# Altium footprint library Molex FFC - FPC Connectors (Through-Hole).PcbLib: 219 footprints (part 5 of 14)
Each footprint in its own frame and in the unit in brackets; x right, y up, seen from the top. Pads: shape width x height; smd on the part's side, far side on the other; paste and mask are expansions set on the pad; w line width, h text height; cw(c..) or ccw(c..) is an arc to the next point about the centre after c.
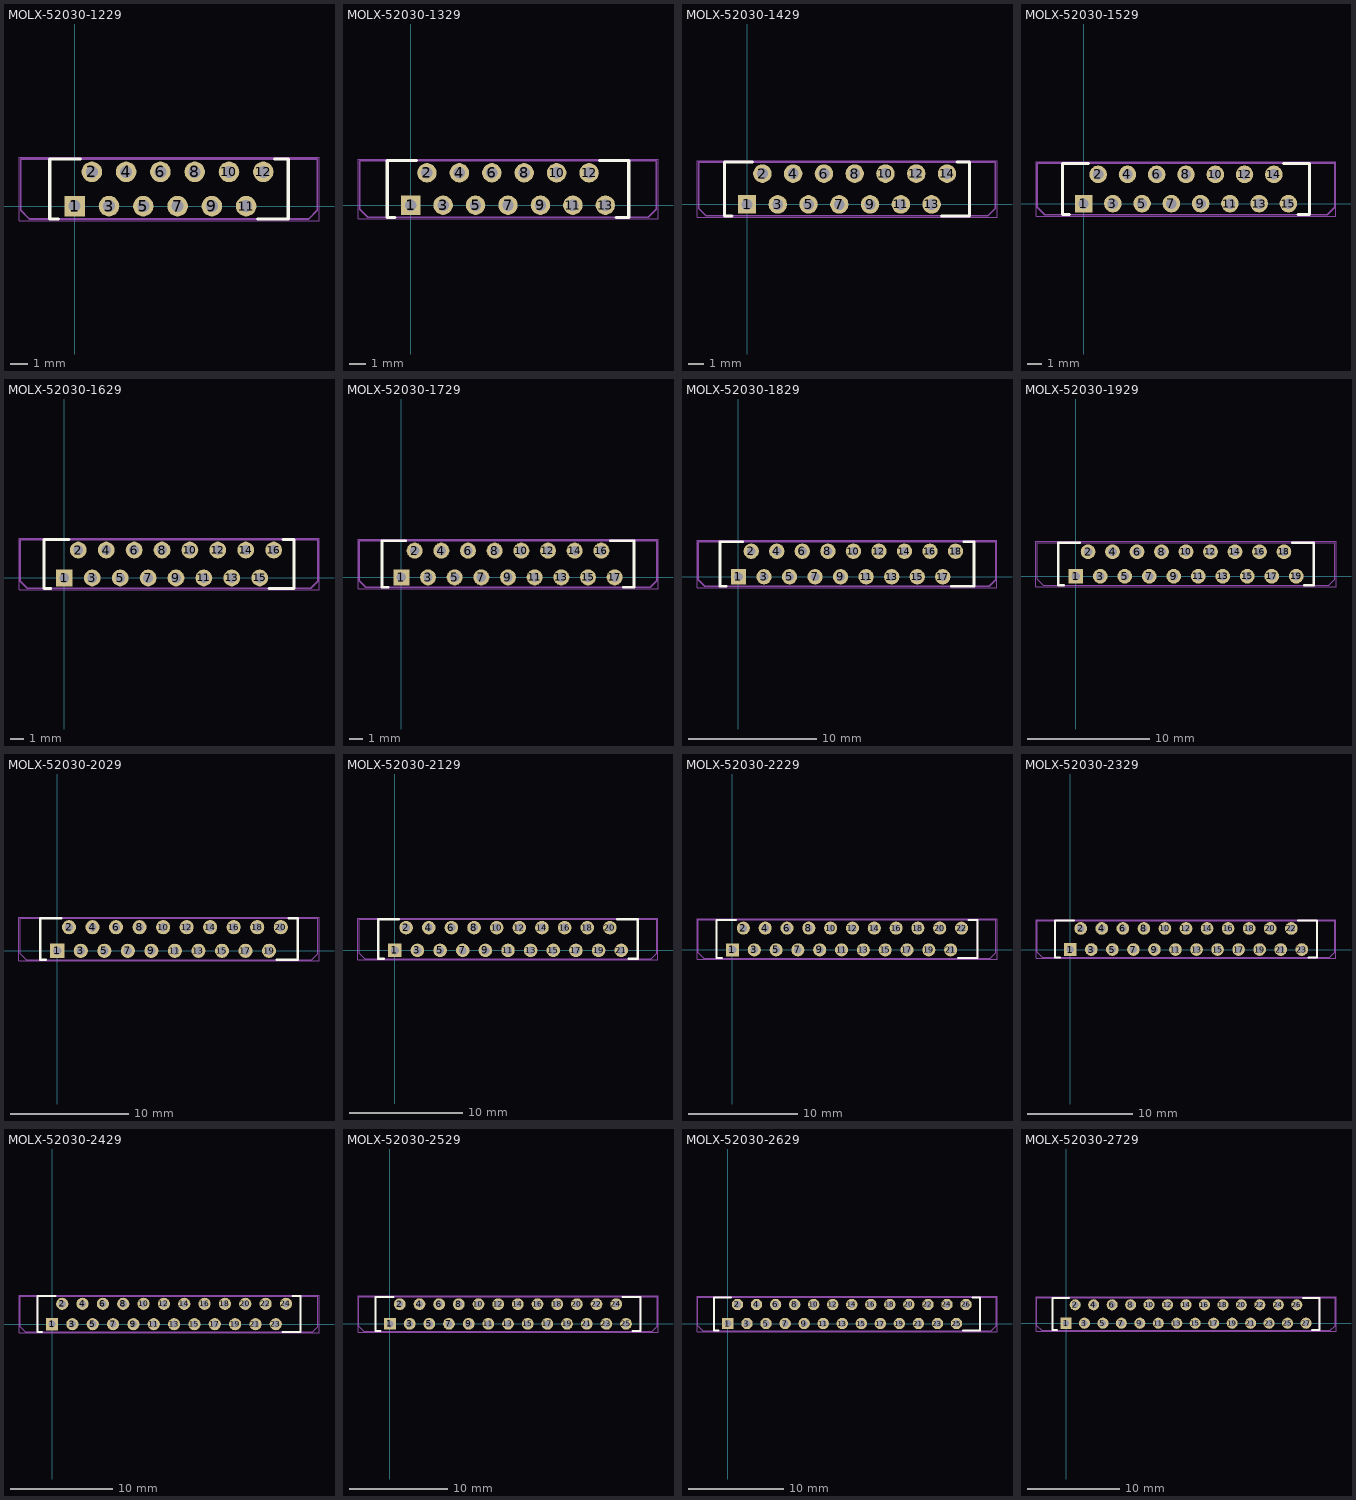
[diagram p4: the footprints below, top view; thin cyan lines are the x and y axes]

## MOLX-52030-1229 [mm] "FPC Connector, 12-Leads, Vertical, Pitch 1.0 mm, Mated Height 5.2 mm, Through Hole"
height 6.712
pads (12):
  rect 1.2x1.2 hole 0.7: 1(0,0)
  round 1.2 hole 0.7: 2(1,2) 3(2,0) 4(3,2) 5(4,0) 6(5,2) 7(6,0) 8(7,2) 9(8,0) 10(9,2) 11(10,0) 12(11,2)
Top Overlay:
  lines w0.2: -0.971,-0.75 -1.45,-0.75 -1.45,2.75 0.339,2.75 ; 10.661,-0.75 12.45,-0.75 12.45,2.75 11.662,2.75
Mechanical 13:
  lines w0.1: -1.45,-0.75 -1.45,2.75 ; 12.45,-0.75 12.45,2.75 ; -3.15,-0.25 -2.65,-0.75 13.65,-0.75 14.15,-0.25 14.15,2.75 -3.15,2.75 -3.15,-0.25
Mechanical 15:
  lines w0.05: -3.25,-0.85 14.25,-0.85 14.25,2.85 -3.25,2.85 -3.25,-0.85
3D body "520301229.stp": height 6.71, standoff -3.19, extent -3.15,-0.75 14.15,2.75

## MOLX-52030-1329 [mm] "FPC Connector, 13-Leads, Vertical, Pitch 1.0 mm, Mated Height 5.2 mm, Through Hole"
height 6.712
pads (13):
  rect 1.2x1.2 hole 0.7: 1(0,0)
  round 1.2 hole 0.7: 2(1,2) 3(2,0) 4(3,2) 5(4,0) 6(5,2) 7(6,0) 8(7,2) 9(8,0) 10(9,2) 11(10,0) 12(11,2) 13(12,0)
Top Overlay:
  lines w0.2: -0.971,-0.75 -1.45,-0.75 -1.45,2.75 0.339,2.75 ; 11.661,2.75 13.45,2.75 13.45,-0.75 12.661,-0.75
Mechanical 13:
  lines w0.1: -1.45,-0.75 -1.45,2.75 ; 13.45,-0.75 13.45,2.75 ; -3.15,-0.25 -3.15,2.75 15.15,2.75 15.15,-0.25 14.65,-0.75 -2.65,-0.75 -3.15,-0.25
Mechanical 15:
  lines w0.05: -3.25,-0.85 -3.25,2.85 15.25,2.85 15.25,-0.85 -3.25,-0.85
3D body "520301329.stp": height 6.71, standoff -3.19, extent -3.15,-0.75 15.15,2.75

## MOLX-52030-1429 [mm] "FPC Connector, 14-Leads, Vertical, Pitch 1.0 mm, Mated Height 5.2 mm, Through Hole"
height 6.712
pads (14):
  rect 1.2x1.2 hole 0.7: 1(0,0)
  round 1.2 hole 0.7: 2(1,2) 3(2,0) 4(3,2) 5(4,0) 6(5,2) 7(6,0) 8(7,2) 9(8,0) 10(9,2) 11(10,0) 12(11,2) 13(12,0) 14(13,2)
Top Overlay:
  lines w0.2: -0.971,-0.75 -1.45,-0.75 -1.45,2.75 0.339,2.75 ; 12.661,-0.75 14.45,-0.75 14.45,2.75 13.662,2.75
Mechanical 13:
  lines w0.1: -1.45,-0.75 -1.45,2.75 ; 14.45,-0.75 14.45,2.75 ; 16.15,-0.25 16.15,2.75 ; 16.15,-0.25 15.65,-0.75 -2.65,-0.75 -3.15,-0.25 -3.15,2.75 16.15,2.75
Mechanical 15:
  lines w0.05: -3.25,-0.85 16.25,-0.85 16.25,2.85 -3.25,2.85 -3.25,-0.85
3D body "520301429.stp": height 6.71, standoff -3.19, extent -3.15,-0.75 16.15,2.75

## MOLX-52030-1529 [mm] "FPC Connector, 15-Leads, Vertical, Pitch 1.0 mm, Mated Height 5.2 mm, Through Hole"
height 6.712
pads (15):
  rect 1.2x1.2 hole 0.7: 1(0,0)
  round 1.2 hole 0.7: 2(1,2) 3(2,0) 4(3,2) 5(4,0) 6(5,2) 7(6,0) 8(7,2) 9(8,0) 10(9,2) 11(10,0) 12(11,2) 13(12,0) 14(13,2) 15(14,0)
Top Overlay:
  lines w0.2: -0.971,-0.75 -1.45,-0.75 -1.45,2.75 0.339,2.75 ; 13.661,2.75 15.45,2.75 15.45,-0.75 14.661,-0.75
Mechanical 13:
  lines w0.1: -1.45,-0.75 -1.45,2.75 ; 15.45,-0.75 15.45,2.75 ; -3.15,-0.25 -2.65,-0.75 16.65,-0.75 17.15,-0.25 17.15,2.75 -3.15,2.75 -3.15,-0.25
Mechanical 15:
  lines w0.05: -3.25,-0.85 17.25,-0.85 17.25,2.85 -3.25,2.85 -3.25,-0.85
3D body "520301529.stp": height 6.71, standoff -3.19, extent -3.15,-0.75 17.15,2.75

## MOLX-52030-1629 [mm] "FPC Connector, 16-Leads, Vertical, Pitch 1.0 mm, Mated Height 5.2 mm, Through Hole"
height 6.712
pads (16):
  rect 1.2x1.2 hole 0.7: 1(0,0)
  round 1.2 hole 0.7: 2(1,2) 3(2,0) 4(3,2) 5(4,0) 6(5,2) 7(6,0) 8(7,2) 9(8,0) 10(9,2) 11(10,0) 12(11,2) 13(12,0) 14(13,2) 15(14,0) 16(15,2)
Top Overlay:
  lines w0.2: -0.971,-0.75 -1.45,-0.75 -1.45,2.75 0.339,2.75 ; 14.661,-0.75 16.45,-0.75 16.45,2.75 15.662,2.75
Mechanical 13:
  lines w0.1: -1.45,-0.75 -1.45,2.75 ; 16.45,-0.75 16.45,2.75 ; -3.15,-0.25 -3.15,2.75 18.15,2.75 18.15,-0.25 17.65,-0.75 -2.65,-0.75 -3.15,-0.25
Mechanical 15:
  lines w0.05: -3.25,-0.85 -3.25,2.85 18.25,2.85 18.25,-0.85 -3.25,-0.85
3D body "520301629.stp": height 6.71, standoff -3.19, extent -3.15,-0.75 18.15,2.75

## MOLX-52030-1729 [mm] "FPC Connector, 17-Leads, Vertical, Pitch 1.0 mm, Mated Height 5.2 mm, Through Hole"
height 6.712
pads (17):
  rect 1.2x1.2 hole 0.7: 1(0,0)
  round 1.2 hole 0.7: 2(1,2) 3(2,0) 4(3,2) 5(4,0) 6(5,2) 7(6,0) 8(7,2) 9(8,0) 10(9,2) 11(10,0) 12(11,2) 13(12,0) 14(13,2) 15(14,0) 16(15,2) 17(16,0)
Top Overlay:
  lines w0.2: -0.971,-0.75 -1.45,-0.75 -1.45,2.75 0.339,2.75 ; 15.661,2.75 17.45,2.75 17.45,-0.75 16.661,-0.75
Mechanical 13:
  lines w0.1: -1.45,-0.75 -1.45,2.75 ; 17.45,-0.75 17.45,2.75 ; -3.15,-0.25 -3.15,2.75 19.15,2.75 19.15,-0.25 18.65,-0.75 -2.65,-0.75 -3.15,-0.25
Mechanical 15:
  lines w0.05: -3.25,-0.85 -3.25,2.85 19.25,2.85 19.25,-0.85 -3.25,-0.85
3D body "520301729.stp": height 6.71, standoff -3.19, extent -3.15,-0.75 19.15,2.75

## MOLX-52030-1829 [mm] "FPC Connector, 18-Leads, Vertical, Pitch 1.0 mm, Mated Height 5.2 mm, Through Hole"
height 6.712
pads (18):
  rect 1.2x1.2 hole 0.7: 1(0,0)
  round 1.2 hole 0.7: 2(1,2) 3(2,0) 4(3,2) 5(4,0) 6(5,2) 7(6,0) 8(7,2) 9(8,0) 10(9,2) 11(10,0) 12(11,2) 13(12,0) 14(13,2) 15(14,0) 16(15,2) 17(16,0) 18(17,2)
Top Overlay:
  lines w0.2: -0.971,-0.75 -1.45,-0.75 -1.45,2.75 0.339,2.75 ; 16.661,-0.75 18.45,-0.75 18.45,2.75 17.662,2.75
Mechanical 13:
  lines w0.1: -1.45,-0.75 -1.45,2.75 ; 18.45,-0.75 18.45,2.75 ; -3.15,-0.25 -2.65,-0.75 19.65,-0.75 20.15,-0.25 20.15,2.75 -3.15,2.75 -3.15,-0.25
Mechanical 15:
  lines w0.05: -3.25,-0.85 20.25,-0.85 20.25,2.85 -3.25,2.85 -3.25,-0.85
3D body "520301829.stp": height 6.71, standoff -3.19, extent -3.15,-0.75 20.15,2.75

## MOLX-52030-1929 [mm] "FPC Connector, 19-Leads, Vertical, Pitch 1.0 mm, Mated Height 5.2 mm, Through Hole"
height 6.712
pads (19):
  rect 1.2x1.2 hole 0.7: 1(0,0)
  round 1.2 hole 0.7: 2(1,2) 3(2,0) 4(3,2) 5(4,0) 6(5,2) 7(6,0) 8(7,2) 9(8,0) 10(9,2) 11(10,0) 12(11,2) 13(12,0) 14(13,2) 15(14,0) 16(15,2) 17(16,0) 18(17,2) 19(18,0)
Top Overlay:
  lines w0.2: -0.971,-0.75 -1.45,-0.75 -1.45,2.75 0.339,2.75 ; 17.661,2.75 19.45,2.75 19.45,-0.75 18.661,-0.75
Mechanical 13:
  lines w0.1: -1.45,-0.75 -1.45,2.75 ; 19.45,-0.75 19.45,2.75 ; 21.15,-0.25 21.15,2.75 ; 21.15,-0.25 20.65,-0.75 -2.65,-0.75 -3.15,-0.25 -3.15,2.75 21.15,2.75
Mechanical 15:
  lines w0.05: -3.25,-0.85 21.25,-0.85 21.25,2.85 -3.25,2.85 -3.25,-0.85
3D body "520301929.stp": height 6.71, standoff -3.19, extent -3.15,-0.75 21.15,2.75

## MOLX-52030-2029 [mm] "FPC Connector, 20-Leads, Vertical, Pitch 1.0 mm, Mated Height 5.2 mm, Through Hole"
height 6.712
pads (20):
  rect 1.2x1.2 hole 0.7: 1(0,0)
  round 1.2 hole 0.7: 2(1,2) 3(2,0) 4(3,2) 5(4,0) 6(5,2) 7(6,0) 8(7,2) 9(8,0) 10(9,2) 11(10,0) 12(11,2) 13(12,0) 14(13,2) 15(14,0) 16(15,2) 17(16,0) 18(17,2) 19(18,0) 20(19,2)
Top Overlay:
  lines w0.2: -0.971,-0.75 -1.45,-0.75 -1.45,2.75 0.339,2.75 ; 18.661,-0.75 20.45,-0.75 20.45,2.75 19.662,2.75
Mechanical 13:
  lines w0.1: -1.45,-0.75 -1.45,2.75 ; 20.45,-0.75 20.45,2.75 ; -3.15,-0.25 -2.65,-0.75 21.65,-0.75 22.15,-0.25 22.15,2.75 -3.15,2.75 -3.15,-0.25
Mechanical 15:
  lines w0.05: -3.25,-0.85 22.25,-0.85 22.25,2.85 -3.25,2.85 -3.25,-0.85
3D body "520302029.stp": height 6.71, standoff -3.19, extent -3.15,-0.75 22.15,2.75

## MOLX-52030-2129 [mm] "FPC Connector, 21-Leads, Vertical, Pitch 1.0 mm, Mated Height 5.2 mm, Through Hole"
height 6.712
pads (21):
  rect 1.2x1.2 hole 0.7: 1(0,0)
  round 1.2 hole 0.7: 2(1,2) 3(2,0) 4(3,2) 5(4,0) 6(5,2) 7(6,0) 8(7,2) 9(8,0) 10(9,2) 11(10,0) 12(11,2) 13(12,0) 14(13,2) 15(14,0) 16(15,2) 17(16,0) 18(17,2) 19(18,0) 20(19,2) 21(20,0)
Top Overlay:
  lines w0.2: -0.971,-0.75 -1.45,-0.75 -1.45,2.75 0.339,2.75 ; 19.661,2.75 21.45,2.75 21.45,-0.75 20.661,-0.75
Mechanical 13:
  lines w0.1: -1.45,-0.75 -1.45,2.75 ; 21.45,-0.75 21.45,2.75 ; -3.15,-0.25 -2.65,-0.75 22.65,-0.75 23.15,-0.25 23.15,2.75 -3.15,2.75 -3.15,-0.25
Mechanical 15:
  lines w0.05: -3.25,-0.85 23.25,-0.85 23.25,2.85 -3.25,2.85 -3.25,-0.85
3D body "520302129.stp": height 6.71, standoff -3.19, extent -3.15,-0.75 23.15,2.75

## MOLX-52030-2229 [mm] "FPC Connector, 22-Leads, Vertical, Pitch 1.0 mm, Mated Height 5.2 mm, Through Hole"
height 6.712
pads (22):
  rect 1.2x1.2 hole 0.7: 1(0,0)
  round 1.2 hole 0.7: 2(1,2) 3(2,0) 4(3,2) 5(4,0) 6(5,2) 7(6,0) 8(7,2) 9(8,0) 10(9,2) 11(10,0) 12(11,2) 13(12,0) 14(13,2) 15(14,0) 16(15,2) 17(16,0) 18(17,2) 19(18,0) 20(19,2) 21(20,0) 22(21,2)
Top Overlay:
  lines w0.2: -0.971,-0.75 -1.45,-0.75 -1.45,2.75 0.339,2.75 ; 20.661,-0.75 22.45,-0.75 22.45,2.75 21.662,2.75
Mechanical 13:
  lines w0.1: -3.15,2.75 24.15,2.75 24.15,-0.25 23.65,-0.75 -2.65,-0.75 -3.15,-0.25 -3.15,2.75 ; -1.45,-0.75 -1.45,2.75 ; 22.45,-0.75 22.45,2.75
Mechanical 15:
  lines w0.05: -3.25,-0.85 -3.25,2.85 24.25,2.85 24.25,-0.85 -3.25,-0.85
3D body "520302229.stp": height 6.71, standoff -3.19, extent -3.15,-0.75 24.15,2.75

## MOLX-52030-2329 [mm] "FPC Connector, 23-Leads, Vertical, Pitch 1.0 mm, Mated Height 5.2 mm, Through Hole"
height 6.712
pads (23):
  rect 1.2x1.2 hole 0.7: 1(0,0)
  round 1.2 hole 0.7: 2(1,2) 3(2,0) 4(3,2) 5(4,0) 6(5,2) 7(6,0) 8(7,2) 9(8,0) 10(9,2) 11(10,0) 12(11,2) 13(12,0) 14(13,2) 15(14,0) 16(15,2) 17(16,0) 18(17,2) 19(18,0) 20(19,2) 21(20,0) 22(21,2) 23(22,0)
Top Overlay:
  lines w0.2: -0.971,-0.75 -1.45,-0.75 -1.45,2.75 0.339,2.75 ; 21.661,2.75 23.45,2.75 23.45,-0.75 22.661,-0.75
Mechanical 13:
  lines w0.1: -1.45,-0.75 -1.45,2.75 ; 23.45,-0.75 23.45,2.75 ; -3.15,-0.25 -3.15,2.75 25.15,2.75 25.15,-0.25 24.65,-0.75 -2.65,-0.75 -3.15,-0.25
Mechanical 15:
  lines w0.05: -3.25,-0.85 -3.25,2.85 25.25,2.85 25.25,-0.85 -3.25,-0.85
3D body "520302329.stp": height 6.71, standoff -3.19, extent -3.15,-0.75 25.15,2.75

## MOLX-52030-2429 [mm] "FPC Connector, 24-Leads, Vertical, Pitch 1.0 mm, Mated Height 5.2 mm, Through Hole"
height 6.712
pads (24):
  rect 1.2x1.2 hole 0.7: 1(0,0)
  round 1.2 hole 0.7: 2(1,2) 3(2,0) 4(3,2) 5(4,0) 6(5,2) 7(6,0) 8(7,2) 9(8,0) 10(9,2) 11(10,0) 12(11,2) 13(12,0) 14(13,2) 15(14,0) 16(15,2) 17(16,0) 18(17,2) 19(18,0) 20(19,2) 21(20,0) 22(21,2) 23(22,0) 24(23,2)
Top Overlay:
  lines w0.2: -0.971,-0.75 -1.45,-0.75 -1.45,2.75 0.339,2.75 ; 22.661,-0.75 24.45,-0.75 24.45,2.75 23.662,2.75
Mechanical 13:
  lines w0.1: -3.15,2.75 26.15,2.75 ; -3.15,2.75 -3.15,-0.25 -2.65,-0.75 25.65,-0.75 ; -1.45,-0.75 -1.45,2.75 ; 24.45,-0.75 24.45,2.75 ; 25.65,-0.749 26.15,-0.25 26.15,2.75
Mechanical 15:
  lines w0.05: -3.25,-0.85 26.25,-0.85 26.25,2.85 -3.25,2.85 -3.25,-0.85
3D body "520302429.stp": height 6.71, standoff -3.19, extent -3.15,-0.75 26.15,2.75

## MOLX-52030-2529 [mm] "FPC Connector, 25-Leads, Vertical, Pitch 1.0 mm, Mated Height 5.2 mm, Through Hole"
height 6.712
pads (25):
  rect 1.2x1.2 hole 0.7: 1(0,0)
  round 1.2 hole 0.7: 2(1,2) 3(2,0) 4(3,2) 5(4,0) 6(5,2) 7(6,0) 8(7,2) 9(8,0) 10(9,2) 11(10,0) 12(11,2) 13(12,0) 14(13,2) 15(14,0) 16(15,2) 17(16,0) 18(17,2) 19(18,0) 20(19,2) 21(20,0) 22(21,2) 23(22,0) 24(23,2) 25(24,0)
Top Overlay:
  lines w0.2: -0.971,-0.75 -1.45,-0.75 -1.45,2.75 0.339,2.75 ; 23.661,2.75 25.45,2.75 25.45,-0.75 24.661,-0.75
Mechanical 13:
  lines w0.1: -1.45,-0.75 -1.45,2.75 ; 25.45,-0.75 25.45,2.75 ; -3.15,-0.25 -2.65,-0.75 26.65,-0.75 27.15,-0.25 27.15,2.75 -3.15,2.75 -3.15,-0.25
Mechanical 15:
  lines w0.05: -3.25,-0.85 27.25,-0.85 27.25,2.85 -3.25,2.85 -3.25,-0.85
3D body "520302529.stp": height 6.71, standoff -3.19, extent -3.15,-0.75 27.15,2.75

## MOLX-52030-2629 [mm] "FPC Connector, 26-Leads, Vertical, Pitch 1.0 mm, Mated Height 5.2 mm, Through Hole"
height 6.712
pads (26):
  rect 1.2x1.2 hole 0.7: 1(0,0)
  round 1.2 hole 0.7: 2(1,2) 3(2,0) 4(3,2) 5(4,0) 6(5,2) 7(6,0) 8(7,2) 9(8,0) 10(9,2) 11(10,0) 12(11,2) 13(12,0) 14(13,2) 15(14,0) 16(15,2) 17(16,0) 18(17,2) 19(18,0) 20(19,2) 21(20,0) 22(21,2) 23(22,0) 24(23,2) 25(24,0) 26(25,2)
Top Overlay:
  lines w0.2: -0.971,-0.75 -1.45,-0.75 -1.45,2.75 0.339,2.75 ; 24.661,-0.75 26.45,-0.75 26.45,2.75 25.662,2.75
Mechanical 13:
  lines w0.1: -3.15,2.75 28.15,2.75 28.15,-0.25 27.65,-0.749 ; -3.15,2.75 -3.15,-0.25 -2.65,-0.75 27.65,-0.75 ; -1.45,-0.75 -1.45,2.75 ; 26.45,-0.75 26.45,2.75
Mechanical 15:
  lines w0.05: -3.25,-0.85 28.25,-0.85 28.25,2.85 -3.25,2.85 -3.25,-0.85
3D body "520302629.stp": height 6.71, standoff -3.19, extent -3.15,-0.75 28.15,2.75

## MOLX-52030-2729 [mm] "FPC Connector, 27-Leads, Vertical, Pitch 1.0 mm, Mated Height 5.2 mm, Through Hole"
height 6.712
pads (27):
  rect 1.2x1.2 hole 0.7: 1(0,0)
  round 1.2 hole 0.7: 2(1,2) 3(2,0) 4(3,2) 5(4,0) 6(5,2) 7(6,0) 8(7,2) 9(8,0) 10(9,2) 11(10,0) 12(11,2) 13(12,0) 14(13,2) 15(14,0) 16(15,2) 17(16,0) 18(17,2) 19(18,0) 20(19,2) 21(20,0) 22(21,2) 23(22,0) 24(23,2) 25(24,0) 26(25,2) 27(26,0)
Top Overlay:
  lines w0.2: -0.971,-0.75 -1.45,-0.75 -1.45,2.75 0.339,2.75 ; 25.661,2.75 27.45,2.75 27.45,-0.75 26.661,-0.75
Mechanical 13:
  lines w0.1: -1.45,-0.75 -1.45,2.75 ; 27.45,-0.75 27.45,2.75 ; -3.15,-0.25 -2.65,-0.75 28.65,-0.75 29.15,-0.25 29.15,2.75 -3.15,2.75 -3.15,-0.25
Mechanical 15:
  lines w0.05: -3.25,-0.85 29.25,-0.85 29.25,2.85 -3.25,2.85 -3.25,-0.85
3D body "520302729.stp": height 6.71, standoff -3.19, extent -3.15,-0.75 29.15,2.75